# Altium footprint library Hare_Library.PcbLib: 252 footprints (part 3 of 16)
Each footprint in its own frame and in the unit in brackets; x right, y up, seen from the top. Pads: shape width x height; smd on the part's side, far side on the other; paste and mask are expansions set on the pad; w line width, h text height; cw(c..) or ccw(c..) is an arc to the next point about the centre after c.
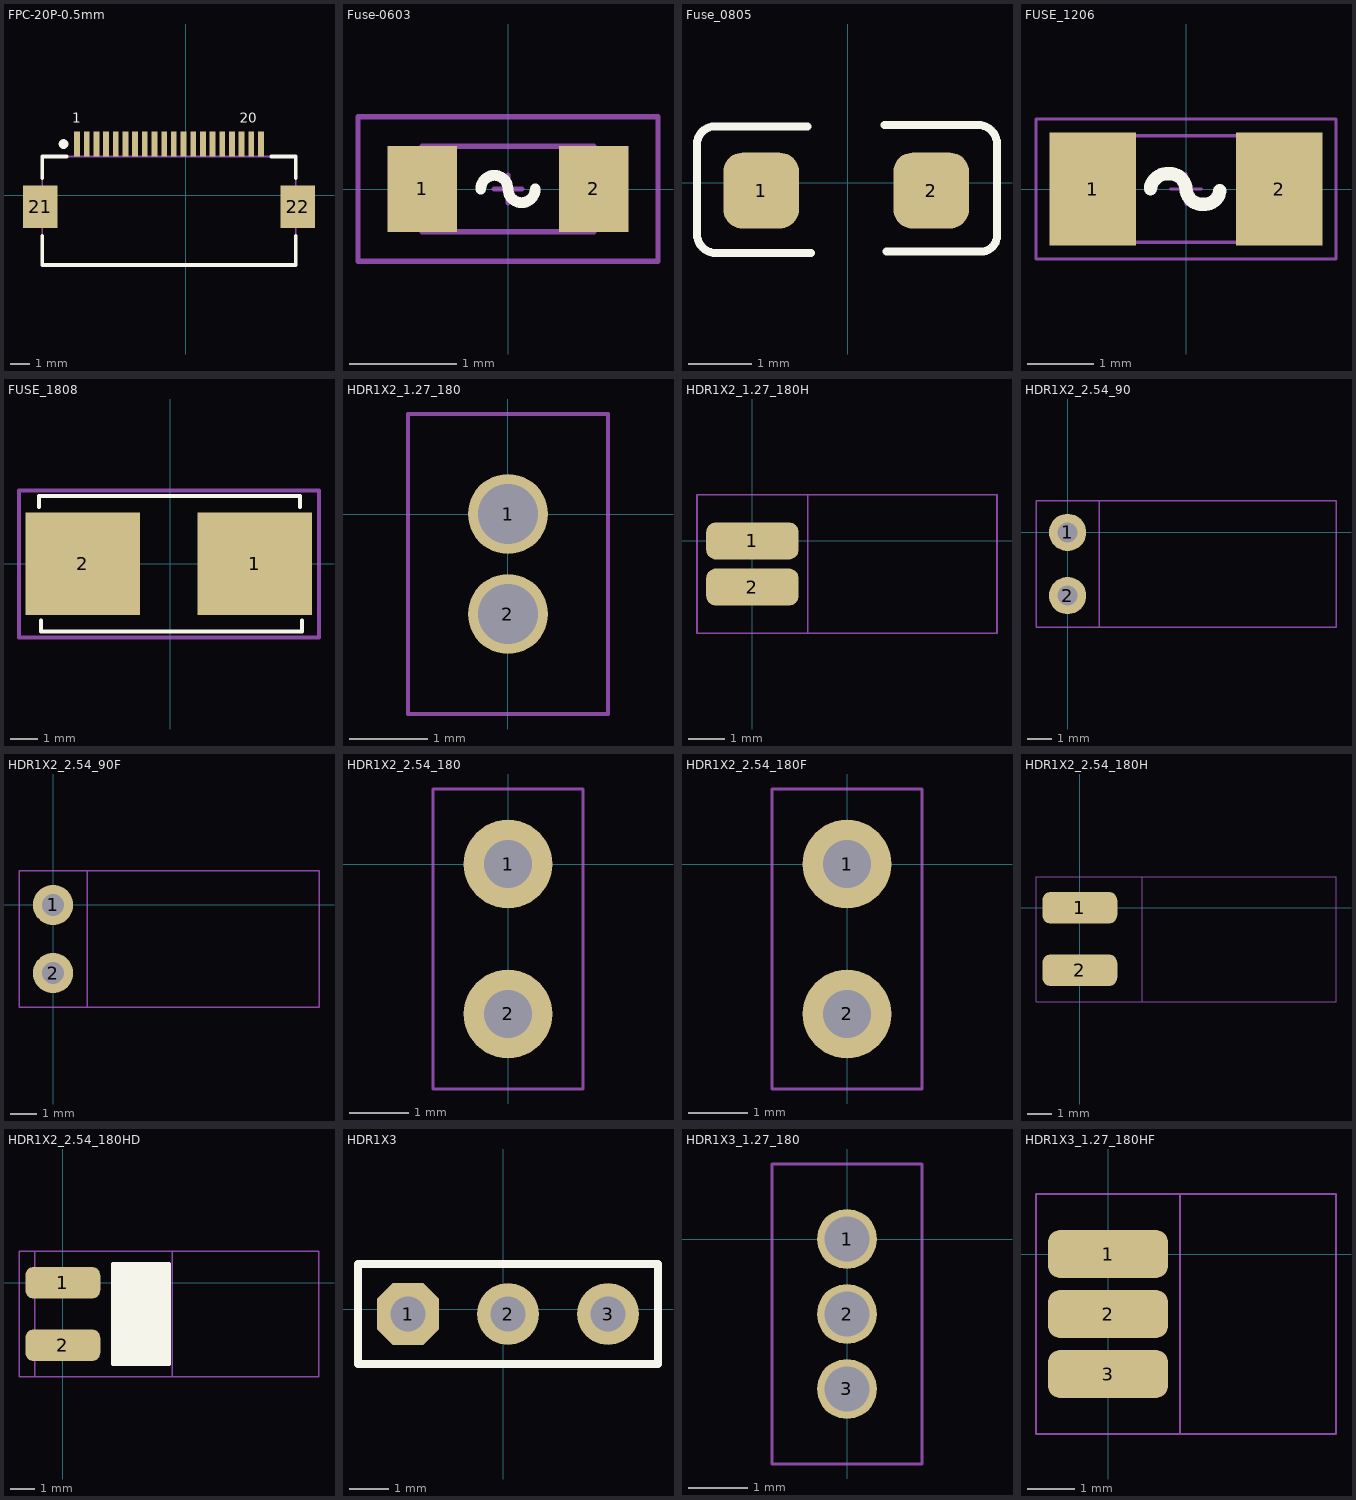
[diagram p2: the footprints below, top view; thin cyan lines are the x and y axes]

## FPC-20P-0.5mm [mm]
pads (22):
  rect 0.3x1.3 smd: 1(-5.608,2.644) 2(-5.108,2.644) 3(-4.608,2.644) 4(-4.108,2.644) 5(-3.608,2.644) 6(-3.108,2.644) 7(-2.608,2.644) 8(-2.108,2.644) 9(-1.608,2.644) 10(-1.108,2.644) 11(-0.608,2.644) 12(-0.108,2.644) 13(0.392,2.644) 14(0.892,2.644) 15(1.392,2.644) 16(1.892,2.644) 17(2.392,2.644) 18(2.892,2.644) 19(3.392,2.644) 20(3.892,2.644)
  rect 1.8x2.2 smd: 21(-7.508,-0.606) 22(5.792,-0.604)
Top Overlay:
  circle w0.25: c-6.308,2.644 r0.125
  lines w0.2: -7.408,-2.104 -7.408,-3.604 5.692,-3.604 5.692,-2.104 ; -7.408,0.896 -7.408,1.996 -6.158,1.996 ; 4.442,1.996 5.692,1.996 5.692,0.896
  text "1" at -5.858,3.744 h0.5
  text "20" at 2.792,3.744 h0.5
Mechanical 13:
  lines w0.1: -7.408,-3.604 -7.408,1.996 5.692,1.996 5.692,-3.604 -7.408,-3.604
3D body: height 2, standoff 0, extent -7.408,-3.604 5.692,1.996

## Fuse-0603 [mm]
height 0.35
pads (2):
  rect 0.65x0.8 smd: 1(-0.8,0) 2(0.8,0)
Top Overlay:
  lines w0.1: -0.254,0 cw(c-0.127,0) -0.127,0.127 cw(c-0.127,0) 0,0 ccw(c0.127,0) 0.127,-0.127 ccw(c0.127,0) 0.254,0
Mechanical 13:
  lines w0.051: -0.127,0 0.127,0 ; 0,-0.127 0,0.127 ; -0.8,-0.4 -0.8,0.4 0.8,0.4 0.8,-0.4 -0.8,-0.4
Mechanical 14:
  lines w0.051: -1.4,-0.675 1.4,-0.675 1.4,0.675 -1.4,0.675 -1.4,-0.675
3D body "RESC1608X05L.step": height 0.45, standoff 0, extent -0.8,-0.4 0.8,0.4

## Fuse_0805 [mm] "500mA保险丝"
pads (2):
  rrect50% 1.2x1.2 smd: 1(-1.372,-0.127) 2(1.321,-0.127)
Top Overlay:
  lines w0.127: -0.635,0.889 -2.108,0.889 ccw(c-2.108,0.61) -2.388,0.61 -2.388,-0.813 ccw(c-2.083,-0.813) -2.083,-1.118 -0.584,-1.118 ; 0.584,0.914 2.057,0.914 cw(c2.057,0.61) 2.362,0.61 2.362,-0.838 cw(c2.108,-0.838) 2.108,-1.092 0.61,-1.092
3D body "User Library-fuse0805L050WR.SLDPRT": height 1.24, standoff 0, extent -1.105,-0.876 1.105,0.622

## FUSE_1206 [mm]
pads (2):
  rect 1.3x1.7 smd: 1(-1.4,0) 2(1.4,0)
Top Overlay:
  lines w0.2: -0.533,0 cw(c-0.279,-0.025) -0.254,0.229 cw(c-0.241,-0.013) 0,0 ccw(c0.241,0.013) 0.254,-0.229 ccw(c0.279,0) 0.508,-0.025
Mechanical 13:
  lines w0.051: -0.229,0 0.229,0 ; 0,-0.229 0,0.229 ; -1.6,-0.8 -1.6,0.8 1.6,0.8 1.6,-0.8 -1.6,-0.8
Mechanical 14:
  lines w0.051: -2.25,-1.05 2.25,-1.05 2.25,1.05 -2.25,1.05 -2.25,-1.05
3D body "R_1206.STEP": height 1.01, standoff -0.01, extent -1.6,-0.8 1.6,0.8

## FUSE_1808 [mm] "1808/2410保险丝座"
height 3
pads (2):
  rect 4.24x3.81 smd: 1(3.125,0) 2(-3.25,0)
Top Overlay:
  lines w0.15: -4.877,2.108 -4.877,2.515 4.801,2.515 4.801,2.108 ; -4.801,-2.108 -4.801,-2.515 4.877,-2.515 4.877,-2.108
Mechanical 14:
  lines w0.15: -5.613,-2.743 5.512,-2.743 5.512,2.718 -5.613,2.718 -5.613,-2.743
3D body "1808 Holder and Fuse.STEP": height 3.74, standoff 0.04, extent -4.9,-2.475 4.8,2.525

## HDR1X2_1.27_180 [mil]
height 169.29
pads (2):
  round 40 hole 30: 1(0,0) 2(0,-50)
Mechanical 13:
  lines w2: -50,-100 50,-100 50,50 -50,50 -50,-100
Mechanical 14:
  lines w2: -50,-100 50,-100 50,50 -50,50 -50,-100
3D body "pin_header_a-sl127-eg-g02d.stp": height 210.24, standoff -102.36, extent -49.21,-74.99 49.21,25.01

## HDR1X2_1.27_180H [mil]
height 169.29
pads (2):
  rrect50% 100x40 smd: 1(0,0) 2(0,-50)
Mechanical 13:
  lines w2: -60,-100 265,-100 265,50 -60,50 -60,-100
Mechanical 14:
  lines w2: -60,-100 60,-100 60,50 -60,50 -60,-100
3D body "pin_header_a-sl127-eg-g02d.stp": height 49.21, standoff -49.21, extent -47.36,-74.99 265.24,25.01

## HDR1X2_2.54_90 [mm]
height 4.3
pads (2):
  round 1.5 hole 0.813: 1(0,0) 2(0,-2.54)
Mechanical 13:
  lines w0.051: -1.27,-3.81 -1.27,1.27 10.795,1.27 10.795,-3.81 -1.27,-3.81
Mechanical 14:
  lines w0.051: -1.27,-3.81 1.27,-3.81 1.27,1.27 -1.27,1.27 -1.27,-3.81
3D body "pin_header_aw140-ea-g02g.stp": height 2.52, standoff -2.38, extent -0.381,-3.71 10.759,1.17

## HDR1X2_2.54_90F [mm]
height 4.3
pads (2):
  round 1.5 hole 0.813: 1(0,0) 2(0,-2.54)
Mechanical 13:
  lines w0.051: -1.27,-3.81 -1.27,1.27 9.906,1.27 9.906,-3.81 -1.27,-3.81
Mechanical 14:
  lines w0.051: -1.27,-3.81 -1.27,1.27 1.27,1.27 1.27,-3.81 -1.27,-3.81
3D body "female_header_a-bl254-ea-g02d.stp": height 2.52, standoff -3.18, extent -0.254,-3.935 9.806,1.395

## HDR1X2_2.54_180 [mm]
height 4.3
pads (2):
  round 1.5 hole 0.813: 1(0,0) 2(0,-2.54)
Mechanical 13:
  lines w0.051: -1.27,-3.81 1.27,-3.81 1.27,1.27 -1.27,1.27 -1.27,-3.81
Mechanical 14:
  lines w0.051: -1.27,-3.81 1.27,-3.81 1.27,1.27 -1.27,1.27 -1.27,-3.81
3D body "pin_header_aw140-eg-g02d.stp": height 8.2, standoff -3, extent -1.249,-3.81 1.249,1.27

## HDR1X2_2.54_180F [mm]
height 4.3
pads (2):
  round 1.5 hole 0.813: 1(0,0) 2(0,-2.54)
Mechanical 13:
  lines w0.051: -1.27,-3.81 -1.27,1.27 1.27,1.27 1.27,-3.81 -1.27,-3.81
Mechanical 14:
  lines w0.051: -1.27,-3.81 1.27,-3.81 1.27,1.27 -1.27,1.27 -1.27,-3.81
3D body "female_header_a-bl254-eg-g02d.stp": height 8.5, standoff -3.2, extent -1.25,-3.935 1.25,1.395

## HDR1X2_2.54_180H [mil]
height 169.29
pads (2):
  rrect50% 120x50 smd: 1(0,0) 2(0,-100)
Mechanical 13:
  lines w2: -70,-150 -70,50 410,50 410,-150 -70,-150
Mechanical 14:
  lines w2: -70,-150 100,-150 100,50 -70,50 -70,-150
3D body "pin_header_aw140-eg-g02d.stp": height 61.32, standoff -37.05, extent -35,-150 405.94,50

## HDR1X2_2.54_180HD [mil]
height 169.29
pads (2):
  rrect50% 120x50 smd: 1(0,0) 2(0,-100)
Top Overlay:
  region: 80,30 170,30 170,-130 80,-130
  lines w6: 80,-130 80,30 170,30 170,-130 80,-130
Mechanical 13:
  lines w2: -45,-150 -45,50 409.65,50 409.65,-150 -45,-150
Mechanical 14:
  lines w2: -70,-150 175,-150 175,50 -70,50 -70,-150
3D body "pin_header_aw140-eg-g02d.stp": height 101.32, standoff 2.95, extent -45.47,-150 395.47,50

## HDR1X3 [mil]
pads (3):
  oct 62x62 hole 35: 1(-95,-5)
  round 62 hole 35: 2(5,-5) 3(105,-5)
Top Overlay:
  lines w8: -145,-55 155,-55 155,45 -145,45 -145,-55
3D body "User Library-Header Vertical 2_54mm Pitch2-11 Way.SLDPRT": height 233.86, standoff -115.75, extent 54,-54.99 154,45.01
3D body "User Library-Header Vertical 2_54mm Pitch2-11 Way.SLDPRT": height 233.86, standoff -115.75, extent -146,-54.99 -46,45.01
3D body "User Library-Header Vertical 2_54mm Pitch2-11 Way.SLDPRT": height 233.86, standoff -115.75, extent -46,-54.99 54,45.01

## HDR1X3_1.27_180 [mil]
height 169.29
pads (3):
  round 40 hole 30: 1(0,0) 2(0,-50) 3(0,-100)
Mechanical 13:
  lines w2: -50,-150 50,-150 50,50 -50,50 -50,-150
Mechanical 14:
  lines w2: -50,-150 50,-150 50,50 -50,50 -50,-150

## HDR1X3_1.27_180HF [mil]
height 169.29
pads (3):
  rrect50% 100x40 smd: 1(0,0) 2(0,-50) 3(0,-100)
Mechanical 13:
  lines w2: -60,-150 190,-150 190,50 -60,50 -60,-150
Mechanical 14:
  lines w2: -60,-150 -60,50 60,50 60,-150 -60,-150
3D body "female_header_a-bl127-eg-g03d.stp": height 35.43, standoff -35.43, extent -38.35,-132.87 190,32.88